# Altium footprint library connectors.PcbLib: 256 footprints (part 4 of 16)
Each footprint in its own frame and in the unit in brackets; x right, y up, seen from the top. Pads: shape width x height; smd on the part's side, far side on the other; paste and mask are expansions set on the pad; w line width, h text height; cw(c..) or ccw(c..) is an arc to the next point about the centre after c.
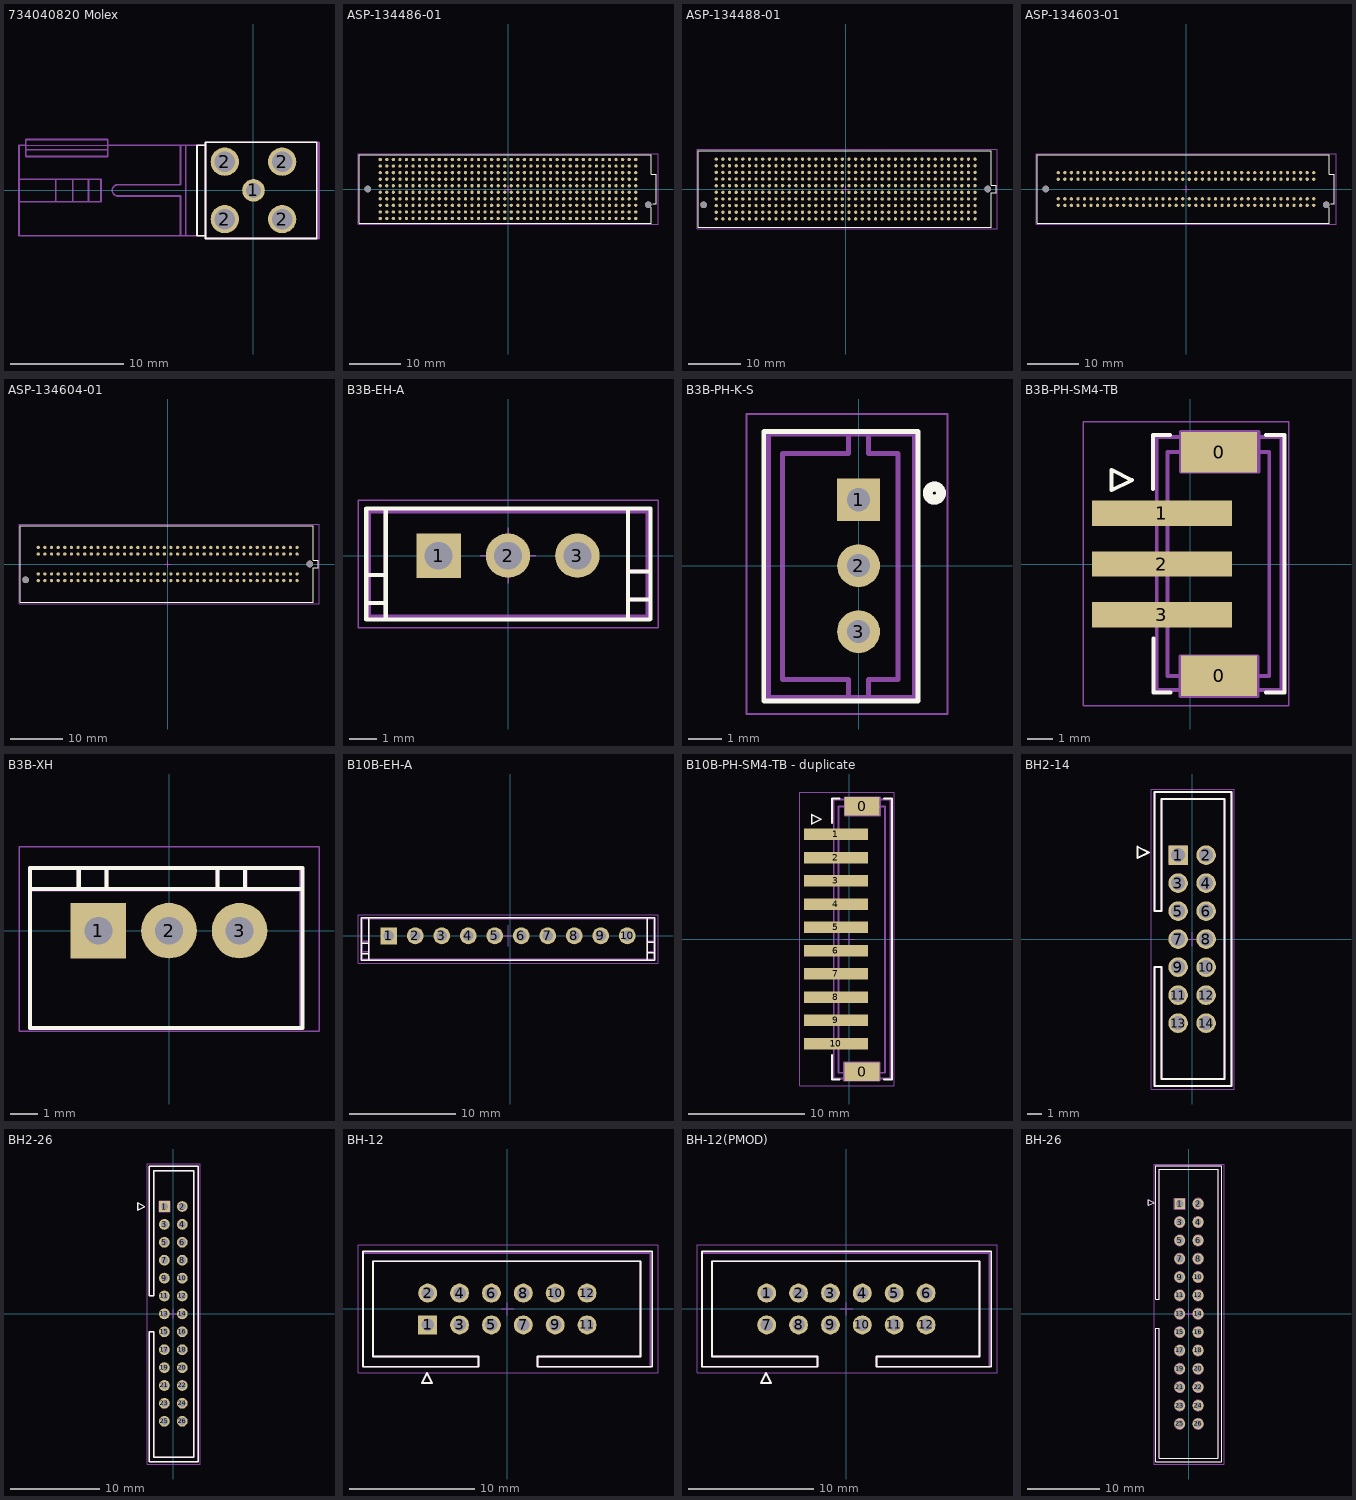
[diagram p3: the footprints below, top view; thin cyan lines are the x and y axes]

## 734040820 Molex [mm] "FAKRA Code Z/Water Blue"
height 9
pads (5):
  round 2 hole 1.3: 1(0,0)
  round 2.5 hole 1.8: 2(-2.54,-2.54) 2(-2.54,2.54) 2(2.54,-2.54) 2(2.54,2.54)
Top Overlay:
  lines w0.15: -4.25,-4 -5,-4 -5,4 -4.25,4 ; -4.25,-4.25 -4.25,4.25 5.6,4.25 5.6,-4.25 -4.25,-4.25
TopAssy 13:
  lines w0.15: -20.75,-1 -13.5,-1 -13.5,1 -20.75,1 ; -20.2,4 -20.75,4 -20.75,-4 -4.25,-4 ; -20.15,3.6 -12.9,3.6 ; -17.5,-1 -17.5,1 ; -16,-1 -16,1 ; -14.6,-1 -14.6,1 ; -12.9,4 -4.25,4 ; -6.45,-4 -6.45,-0.5 -12,-0.5 cw(c-12,0) -12,0.5 -6.45,0.5 -6.45,4 ; -6,-4 -6,3.9 ; -5,-4 -5,4 ; 5.6,-4.25 5.6,4.25 ; -20.15,3 -20.15,4.5 -12.9,4.5 -12.9,3 -20.15,3 ; -4.25,-4.25 -4.25,4.25 5.8,4.25 5.8,-4.25 -4.25,-4.25
TopCourt 15:
  lines w0.05: -4.25,-4 -20.75,-4 -20.75,4 -4.25,4 ; -4.25,-4.25 5.8,-4.25 5.8,4.25 -4.25,4.25 -4.25,-4.25
3D body "734040820.stp": height 11.27, standoff -2.78, extent -20.225,-4 5.495,4

## ASP-134486-01 [mil] "CC-HPC-10, 1.27mm PITCH SOCKET ARRAY ASSEMBLY, FEMALE, VITA 57 CONNECTOR"
height 258
pads (402):
  round 25 smd paste+5 mask+2.01: A1(975,-225) A2(925,-225) A3(875,-225) A4(825,-225) A5(775,-225) A6(725,-225) A7(675,-225) A8(625,-225) A9(575,-225) A10(525,-225) A11(475,-225) A12(425,-225) A13(375,-225) A14(325,-225) A15(275,-225) A16(225,-225) A17(175,-225) A18(125,-225) A19(75,-225) A20(25,-225) A21(-25,-225) A22(-75,-225) A23(-125,-225) A24(-175,-225) A25(-225,-225) A26(-275,-225) A27(-325,-225) A28(-375,-225) A29(-425,-225) A30(-475,-225) A31(-525,-225) A32(-575,-225) A33(-625,-225) A34(-675,-225) A35(-725,-225) A36(-775,-225) A37(-825,-225) A38(-875,-225) A39(-925,-225) A40(-975,-225) B1(975,-175) B2(925,-175) B3(875,-175) B4(825,-175) B5(775,-175) B6(725,-175) B7(675,-175) B8(625,-175) B9(575,-175) B10(525,-175) B11(475,-175) B12(425,-175) B13(375,-175) B14(325,-175) B15(275,-175) B16(225,-175) B17(175,-175) B18(125,-175) B19(75,-175) B20(25,-175) B21(-25,-175) B22(-75,-175) B23(-125,-175) B24(-175,-175) B25(-225,-175) B26(-275,-175) B27(-325,-175) B28(-375,-175) B29(-425,-175) B30(-475,-175) B31(-525,-175) B32(-575,-175) B33(-625,-175) B34(-675,-175) B35(-725,-175) B36(-775,-175) B37(-825,-175) B38(-875,-175) B39(-925,-175) B40(-975,-175) E1(975,-25) E2(925,-25) E3(875,-25) E4(825,-25) E5(775,-25) E6(725,-25) E7(675,-25) E8(625,-25) E9(575,-25) E10(525,-25) E11(475,-25) E12(425,-25) E13(375,-25) E14(325,-25) E15(275,-25) E16(225,-25) E17(175,-25) E18(125,-25) E19(75,-25) E20(25,-25) E21(-25,-25) E22(-75,-25) E23(-125,-25) E24(-175,-25) E25(-225,-25) E26(-275,-25) E27(-325,-25) E28(-375,-25) E29(-425,-25) E30(-475,-25) E31(-525,-25) E32(-575,-25) E33(-625,-25) E34(-675,-25) E35(-725,-25) E36(-775,-25) E37(-825,-25) E38(-875,-25) E39(-925,-25) E40(-975,-25) F1(975,25) F2(925,25) F3(875,25) F4(825,25) F5(775,25) F6(725,25) F7(675,25) F8(625,25) F9(575,25) F10(525,25) F11(475,25) F12(425,25) F13(375,25) F14(325,25) F15(275,25) F16(225,25) F17(175,25) F18(125,25) F19(75,25) F20(25,25) F21(-25,25) F22(-75,25) F23(-125,25) F24(-175,25) F25(-225,25) F26(-275,25) F27(-325,25) F28(-375,25) F29(-425,25) F30(-475,25) F31(-525,25) F32(-575,25) F33(-625,25) F34(-675,25) F35(-725,25) F36(-775,25) F37(-825,25) F38(-875,25) F39(-925,25) F40(-975,25) J1(975,175) J2(925,175) J3(875,175) J4(825,175) J5(775,175) J6(725,175) J7(675,175) J8(625,175) J9(575,175) J10(525,175) J11(475,175) J12(425,175) J13(375,175) J14(325,175) J15(275,175) J16(225,175) J17(175,175) J18(125,175) J19(75,175) J20(25,175) J21(-25,175) J22(-75,175) J23(-125,175) J24(-175,175) J25(-225,175) J26(-275,175) J27(-325,175) J28(-375,175) J29(-425,175) J30(-475,175) J31(-525,175) J32(-575,175) J33(-625,175) J34(-675,175) J35(-725,175) J36(-775,175) J37(-825,175) J38(-875,175) J39(-925,175) J40(-975,175) K1(975,225) K2(925,225) K3(875,225) K4(825,225) K5(775,225) K6(725,225) K7(675,225) K8(625,225) K9(575,225) K10(525,225) K11(475,225) K12(425,225) K13(375,225) K14(325,225) K15(275,225) K16(225,225) K17(175,225) K18(125,225) K19(75,225) K20(25,225) K21(-25,225) K22(-75,225) K23(-125,225) K24(-175,225) K25(-225,225) K26(-275,225) K27(-325,225) K28(-375,225) K29(-425,225) K30(-475,225) K31(-525,225) K32(-575,225) K33(-625,225) K34(-675,225) K35(-725,225) K36(-775,225) K37(-825,225) K38(-875,225) K39(-925,225) K40(-975,225)
  round 25 smd paste+5 mask+2: C1(975,-125) C2(925,-125) C3(875,-125) C4(825,-125) C5(775,-125) C6(725,-125) C7(675,-125) C8(625,-125) C9(575,-125) C10(525,-125) C11(475,-125) C12(425,-125) C13(375,-125) C14(325,-125) C15(275,-125) C16(225,-125) C17(175,-125) C18(125,-125) C19(75,-125) C20(25,-125) C21(-25,-125) C22(-75,-125) C23(-125,-125) C24(-175,-125) C25(-225,-125) C26(-275,-125) C27(-325,-125) C28(-375,-125) C29(-425,-125) C30(-475,-125) C31(-525,-125) C32(-575,-125) C33(-625,-125) C34(-675,-125) C35(-725,-125) C36(-775,-125) C37(-825,-125) C38(-875,-125) C39(-925,-125) C40(-975,-125) D1(975,-75) D2(925,-75) D3(875,-75) D4(825,-75) D5(775,-75) D6(725,-75) D7(675,-75) D8(625,-75) D9(575,-75) D10(525,-75) D11(475,-75) D12(425,-75) D13(375,-75) D14(325,-75) D15(275,-75) D16(225,-75) D17(175,-75) D18(125,-75) D19(75,-75) D20(25,-75) D21(-25,-75) D22(-75,-75) D23(-125,-75) D24(-175,-75) D25(-225,-75) D26(-275,-75) D27(-325,-75) D28(-375,-75) D29(-425,-75) D30(-475,-75) D31(-525,-75) D32(-575,-75) D33(-625,-75) D34(-675,-75) D35(-725,-75) D36(-775,-75) D37(-825,-75) D38(-875,-75) D39(-925,-75) D40(-975,-75) G1(975,75) G2(925,75) G3(875,75) G4(825,75) G5(775,75) G6(725,75) G7(675,75) G8(625,75) G9(575,75) G10(525,75) G11(475,75) G12(425,75) G13(375,75) G14(325,75) G15(275,75) G16(225,75) G17(175,75) G18(125,75) G19(75,75) G20(25,75) G21(-25,75) G22(-75,75) G23(-125,75) G24(-175,75) G25(-225,75) G26(-275,75) G27(-325,75) G28(-375,75) G29(-425,75) G30(-475,75) G31(-525,75) G32(-575,75) G33(-625,75) G34(-675,75) G35(-725,75) G36(-775,75) G37(-825,75) G38(-875,75) G39(-925,75) G40(-975,75) H1(975,125) H2(925,125) H3(875,125) H4(825,125) H5(775,125) H6(725,125) H7(675,125) H8(625,125) H9(575,125) H10(525,125) H11(475,125) H12(425,125) H13(375,125) H14(325,125) H15(275,125) H16(225,125) H17(175,125) H18(125,125) H19(75,125) H20(25,125) H21(-25,125) H22(-75,125) H23(-125,125) H24(-175,125) H25(-225,125) H26(-275,125) H27(-325,125) H28(-375,125) H29(-425,125) H30(-475,125) H31(-525,125) H32(-575,125) H33(-625,125) H34(-675,125) H35(-725,125) H36(-775,125) H37(-825,125) H38(-875,125) H39(-925,125) H40(-975,125)
  round 50 hole 50 unplated paste+0 mask+0: MH1(-1070.5,0) MH2(1070.5,-120)
Top Overlay:
  lines w7.87: 1095,-140 1095,-260 -1135,-260 -1135,260 1095,260 1095,112.2 1133,112.2 1133,-113.19 1105,-113.19
TopCourt 15:
  lines w3.94: -25,0 25,0 ; 0,-25 0,25 ; -1145,-270 -1145,270 1145,270 1145,-270 -1145,-270
3D body "SEAF-40-06.5-L-10-2-A-K-TR.stp": height 259, standoff -49, extent -1131,-262.5 1131,260.5

## ASP-134488-01 [mil] "MC-HPC-10, 1.27mm PITCH TERMINAL ARRAY ASSEMBLY, MALE, VITA 57 CONNECTOR"
height 280
pads (402):
  round 25 smd paste+5 mask+2.01: A1(975,225) A2(925,225) A3(875,225) A4(825,225) A5(775,225) A6(725,225) A7(675,225) A8(625,225) A9(575,225) A10(525,225) A11(475,225) A12(425,225) A13(375,225) A14(325,225) A15(275,225) A16(225,225) A17(175,225) A18(125,225) A19(75,225) A20(25,225) A21(-25,225) A22(-75,225) A23(-125,225) A24(-175,225) A25(-225,225) A26(-275,225) A27(-325,225) A28(-375,225) A29(-425,225) A30(-475,225) A31(-525,225) A32(-575,225) A33(-625,225) A34(-675,225) A35(-725,225) A36(-775,225) A37(-825,225) A38(-875,225) A39(-925,225) A40(-975,225) B1(975,175) B2(925,175) B3(875,175) B4(825,175) B5(775,175) B6(725,175) B7(675,175) B8(625,175) B9(575,175) B10(525,175) B11(475,175) B12(425,175) B13(375,175) B14(325,175) B15(275,175) B16(225,175) B17(175,175) B18(125,175) B19(75,175) B20(25,175) B21(-25,175) B22(-75,175) B23(-125,175) B24(-175,175) B25(-225,175) B26(-275,175) B27(-325,175) B28(-375,175) B29(-425,175) B30(-475,175) B31(-525,175) B32(-575,175) B33(-625,175) B34(-675,175) B35(-725,175) B36(-775,175) B37(-825,175) B38(-875,175) B39(-925,175) B40(-975,175) E1(975,25) E2(925,25) E3(875,25) E4(825,25) E5(775,25) E6(725,25) E7(675,25) E8(625,25) E9(575,25) E10(525,25) E11(475,25) E12(425,25) E13(375,25) E14(325,25) E15(275,25) E16(225,25) E17(175,25) E18(125,25) E19(75,25) E20(25,25) E21(-25,25) E22(-75,25) E23(-125,25) E24(-175,25) E25(-225,25) E26(-275,25) E27(-325,25) E28(-375,25) E29(-425,25) E30(-475,25) E31(-525,25) E32(-575,25) E33(-625,25) E34(-675,25) E35(-725,25) E36(-775,25) E37(-825,25) E38(-875,25) E39(-925,25) E40(-975,25) F1(975,-25) F2(925,-25) F3(875,-25) F4(825,-25) F5(775,-25) F6(725,-25) F7(675,-25) F8(625,-25) F9(575,-25) F10(525,-25) F11(475,-25) F12(425,-25) F13(375,-25) F14(325,-25) F15(275,-25) F16(225,-25) F17(175,-25) F18(125,-25) F19(75,-25) F20(25,-25) F21(-25,-25) F22(-75,-25) F23(-125,-25) F24(-175,-25) F25(-225,-25) F26(-275,-25) F27(-325,-25) F28(-375,-25) F29(-425,-25) F30(-475,-25) F31(-525,-25) F32(-575,-25) F33(-625,-25) F34(-675,-25) F35(-725,-25) F36(-775,-25) F37(-825,-25) F38(-875,-25) F39(-925,-25) F40(-975,-25) J1(975,-175) J2(925,-175) J3(875,-175) J4(825,-175) J5(775,-175) J6(725,-175) J7(675,-175) J8(625,-175) J9(575,-175) J10(525,-175) J11(475,-175) J12(425,-175) J13(375,-175) J14(325,-175) J15(275,-175) J16(225,-175) J17(175,-175) J18(125,-175) J19(75,-175) J20(25,-175) J21(-25,-175) J22(-75,-175) J23(-125,-175) J24(-175,-175) J25(-225,-175) J26(-275,-175) J27(-325,-175) J28(-375,-175) J29(-425,-175) J30(-475,-175) J31(-525,-175) J32(-575,-175) J33(-625,-175) J34(-675,-175) J35(-725,-175) J36(-775,-175) J37(-825,-175) J38(-875,-175) J39(-925,-175) J40(-975,-175) K1(975,-225) K2(925,-225) K3(875,-225) K4(825,-225) K5(775,-225) K6(725,-225) K7(675,-225) K8(625,-225) K9(575,-225) K10(525,-225) K11(475,-225) K12(425,-225) K13(375,-225) K14(325,-225) K15(275,-225) K16(225,-225) K17(175,-225) K18(125,-225) K19(75,-225) K20(25,-225) K21(-25,-225) K22(-75,-225) K23(-125,-225) K24(-175,-225) K25(-225,-225) K26(-275,-225) K27(-325,-225) K28(-375,-225) K29(-425,-225) K30(-475,-225) K31(-525,-225) K32(-575,-225) K33(-625,-225) K34(-675,-225) K35(-725,-225) K36(-775,-225) K37(-825,-225) K38(-875,-225) K39(-925,-225) K40(-975,-225)
  round 25 smd paste+5 mask+2: C1(975,125) C2(925,125) C3(875,125) C4(825,125) C5(775,125) C6(725,125) C7(675,125) C8(625,125) C9(575,125) C10(525,125) C11(475,125) C12(425,125) C13(375,125) C14(325,125) C15(275,125) C16(225,125) C17(175,125) C18(125,125) C19(75,125) C20(25,125) C21(-25,125) C22(-75,125) C23(-125,125) C24(-175,125) C25(-225,125) C26(-275,125) C27(-325,125) C28(-375,125) C29(-425,125) C30(-475,125) C31(-525,125) C32(-575,125) C33(-625,125) C34(-675,125) C35(-725,125) C36(-775,125) C37(-825,125) C38(-875,125) C39(-925,125) C40(-975,125) D1(975,75) D2(925,75) D3(875,75) D4(825,75) D5(775,75) D6(725,75) D7(675,75) D8(625,75) D9(575,75) D10(525,75) D11(475,75) D12(425,75) D13(375,75) D14(325,75) D15(275,75) D16(225,75) D17(175,75) D18(125,75) D19(75,75) D20(25,75) D21(-25,75) D22(-75,75) D23(-125,75) D24(-175,75) D25(-225,75) D26(-275,75) D27(-325,75) D28(-375,75) D29(-425,75) D30(-475,75) D31(-525,75) D32(-575,75) D33(-625,75) D34(-675,75) D35(-725,75) D36(-775,75) D37(-825,75) D38(-875,75) D39(-925,75) D40(-975,75) G1(975,-75) G2(925,-75) G3(875,-75) G4(825,-75) G5(775,-75) G6(725,-75) G7(675,-75) G8(625,-75) G9(575,-75) G10(525,-75) G11(475,-75) G12(425,-75) G13(375,-75) G14(325,-75) G15(275,-75) G16(225,-75) G17(175,-75) G18(125,-75) G19(75,-75) G20(25,-75) G21(-25,-75) G22(-75,-75) G23(-125,-75) G24(-175,-75) G25(-225,-75) G26(-275,-75) G27(-325,-75) G28(-375,-75) G29(-425,-75) G30(-475,-75) G31(-525,-75) G32(-575,-75) G33(-625,-75) G34(-675,-75) G35(-725,-75) G36(-775,-75) G37(-825,-75) G38(-875,-75) G39(-925,-75) G40(-975,-75) H1(975,-125) H2(925,-125) H3(875,-125) H4(825,-125) H5(775,-125) H6(725,-125) H7(675,-125) H8(625,-125) H9(575,-125) H10(525,-125) H11(475,-125) H12(425,-125) H13(375,-125) H14(325,-125) H15(275,-125) H16(225,-125) H17(175,-125) H18(125,-125) H19(75,-125) H20(25,-125) H21(-25,-125) H22(-75,-125) H23(-125,-125) H24(-175,-125) H25(-225,-125) H26(-275,-125) H27(-325,-125) H28(-375,-125) H29(-425,-125) H30(-475,-125) H31(-525,-125) H32(-575,-125) H33(-625,-125) H34(-675,-125) H35(-725,-125) H36(-775,-125) H37(-825,-125) H38(-875,-125) H39(-925,-125) H40(-975,-125)
  round 50 hole 50 unplated paste+0 mask+0: MH1(1070.5,0) MH2(-1070.5,-120)
Top Overlay:
  lines w7.87: -1110,-289 -1110,289 1098,289 1098,30 1133,30 1133,-30 1098,-30 1098,-289 -1110,-289
TopCourt 15:
  lines w3.94: -25,0 25,0 ; 0,-25 0,25 ; 1140,-35 1140,300 -1120,300 -1120,-300 1120,-300 1140,-300 1140,-20
3D body "SEAM-40-03.5-S-10-2-A-K-TR.stp": height 281.07, standoff -48.93, extent -1098,-289 1133,289

## ASP-134603-01 [mil] "CC-LPC-10, 1.27mm PITCH SOCKET ARRAY ASSEMBLY, FEMALE, VITA 57 CONNECTOR"
height 258
pads (162):
  round 25 smd paste+5 mask+2: C1(975,-125) C2(925,-125) C3(875,-125) C4(825,-125) C5(775,-125) C6(725,-125) C7(675,-125) C8(625,-125) C9(575,-125) C10(525,-125) C11(475,-125) C12(425,-125) C13(375,-125) C14(325,-125) C15(275,-125) C16(225,-125) C17(175,-125) C18(125,-125) C19(75,-125) C20(25,-125) C21(-25,-125) C22(-75,-125) C23(-125,-125) C24(-175,-125) C25(-225,-125) C26(-275,-125) C27(-325,-125) C28(-375,-125) C29(-425,-125) C30(-475,-125) C31(-525,-125) C32(-575,-125) C33(-625,-125) C34(-675,-125) C35(-725,-125) C36(-775,-125) C37(-825,-125) C38(-875,-125) C39(-925,-125) C40(-975,-125) D1(975,-75) D2(925,-75) D3(875,-75) D4(825,-75) D5(775,-75) D6(725,-75) D7(675,-75) D8(625,-75) D9(575,-75) D10(525,-75) D11(475,-75) D12(425,-75) D13(375,-75) D14(325,-75) D15(275,-75) D16(225,-75) D17(175,-75) D18(125,-75) D19(75,-75) D20(25,-75) D21(-25,-75) D22(-75,-75) D23(-125,-75) D24(-175,-75) D25(-225,-75) D26(-275,-75) D27(-325,-75) D28(-375,-75) D29(-425,-75) D30(-475,-75) D31(-525,-75) D32(-575,-75) D33(-625,-75) D34(-675,-75) D35(-725,-75) D36(-775,-75) D37(-825,-75) D38(-875,-75) D39(-925,-75) D40(-975,-75) G1(975,75) G2(925,75) G3(875,75) G4(825,75) G5(775,75) G6(725,75) G7(675,75) G8(625,75) G9(575,75) G10(525,75) G11(475,75) G12(425,75) G13(375,75) G14(325,75) G15(275,75) G16(225,75) G17(175,75) G18(125,75) G19(75,75) G20(25,75) G21(-25,75) G22(-75,75) G23(-125,75) G24(-175,75) G25(-225,75) G26(-275,75) G27(-325,75) G28(-375,75) G29(-425,75) G30(-475,75) G31(-525,75) G32(-575,75) G33(-625,75) G34(-675,75) G35(-725,75) G36(-775,75) G37(-825,75) G38(-875,75) G39(-925,75) G40(-975,75) H1(975,125) H2(925,125) H3(875,125) H4(825,125) H5(775,125) H6(725,125) H7(675,125) H8(625,125) H9(575,125) H10(525,125) H11(475,125) H12(425,125) H13(375,125) H14(325,125) H15(275,125) H16(225,125) H17(175,125) H18(125,125) H19(75,125) H20(25,125) H21(-25,125) H22(-75,125) H23(-125,125) H24(-175,125) H25(-225,125) H26(-275,125) H27(-325,125) H28(-375,125) H29(-425,125) H30(-475,125) H31(-525,125) H32(-575,125) H33(-625,125) H34(-675,125) H35(-725,125) H36(-775,125) H37(-825,125) H38(-875,125) H39(-925,125) H40(-975,125)
  round 50 hole 50 unplated paste+0 mask+0: MH1(-1070.5,0) MH2(1070.5,-120)
Top Overlay:
  lines w7.87: 1095,-140 1095,-260 -1135,-260 -1135,260 1095,260 1095,112.2 1133,112.2 1133,-113.19 1105,-113.19
TopCourt 15:
  lines w3.94: -25,0 25,0 ; 0,-25 0,25 ; -1145,-270 -1145,270 1145,270 1145,-270 -1145,-270
3D body "SEAF-40-06.5-L-10-2-A-K-TR.stp": height 259, standoff -49, extent -1131,-262.5 1131,260.5

## ASP-134604-01 [mil] "MC-LPC-10, 1.27mm PITCH TERMINAL ARRAY ASSEMBLY, MALE, VITA 57 CONNECTOR"
height 280
pads (162):
  round 25 smd paste+5 mask+2: C1(975,125) C2(925,125) C3(875,125) C4(825,125) C5(775,125) C6(725,125) C7(675,125) C8(625,125) C9(575,125) C10(525,125) C11(475,125) C12(425,125) C13(375,125) C14(325,125) C15(275,125) C16(225,125) C17(175,125) C18(125,125) C19(75,125) C20(25,125) C21(-25,125) C22(-75,125) C23(-125,125) C24(-175,125) C25(-225,125) C26(-275,125) C27(-325,125) C28(-375,125) C29(-425,125) C30(-475,125) C31(-525,125) C32(-575,125) C33(-625,125) C34(-675,125) C35(-725,125) C36(-775,125) C37(-825,125) C38(-875,125) C39(-925,125) C40(-975,125) D1(975,75) D2(925,75) D3(875,75) D4(825,75) D5(775,75) D6(725,75) D7(675,75) D8(625,75) D9(575,75) D10(525,75) D11(475,75) D12(425,75) D13(375,75) D14(325,75) D15(275,75) D16(225,75) D17(175,75) D18(125,75) D19(75,75) D20(25,75) D21(-25,75) D22(-75,75) D23(-125,75) D24(-175,75) D25(-225,75) D26(-275,75) D27(-325,75) D28(-375,75) D29(-425,75) D30(-475,75) D31(-525,75) D32(-575,75) D33(-625,75) D34(-675,75) D35(-725,75) D36(-775,75) D37(-825,75) D38(-875,75) D39(-925,75) D40(-975,75) G1(975,-75) G2(925,-75) G3(875,-75) G4(825,-75) G5(775,-75) G6(725,-75) G7(675,-75) G8(625,-75) G9(575,-75) G10(525,-75) G11(475,-75) G12(425,-75) G13(375,-75) G14(325,-75) G15(275,-75) G16(225,-75) G17(175,-75) G18(125,-75) G19(75,-75) G20(25,-75) G21(-25,-75) G22(-75,-75) G23(-125,-75) G24(-175,-75) G25(-225,-75) G26(-275,-75) G27(-325,-75) G28(-375,-75) G29(-425,-75) G30(-475,-75) G31(-525,-75) G32(-575,-75) G33(-625,-75) G34(-675,-75) G35(-725,-75) G36(-775,-75) G37(-825,-75) G38(-875,-75) G39(-925,-75) G40(-975,-75) H1(975,-125) H2(925,-125) H3(875,-125) H4(825,-125) H5(775,-125) H6(725,-125) H7(675,-125) H8(625,-125) H9(575,-125) H10(525,-125) H11(475,-125) H12(425,-125) H13(375,-125) H14(325,-125) H15(275,-125) H16(225,-125) H17(175,-125) H18(125,-125) H19(75,-125) H20(25,-125) H21(-25,-125) H22(-75,-125) H23(-125,-125) H24(-175,-125) H25(-225,-125) H26(-275,-125) H27(-325,-125) H28(-375,-125) H29(-425,-125) H30(-475,-125) H31(-525,-125) H32(-575,-125) H33(-625,-125) H34(-675,-125) H35(-725,-125) H36(-775,-125) H37(-825,-125) H38(-875,-125) H39(-925,-125) H40(-975,-125)
  round 50 hole 50 unplated paste+0 mask+0: MH1(1070.5,0) MH2(-1070.5,-120)
Top Overlay:
  lines w7.87: -1110,-289 -1110,289 1098,289 1098,30 1133,30 1133,-30 1098,-30 1098,-289 -1110,-289
TopCourt 15:
  lines w3.94: -25,0 25,0 ; 0,-25 0,25 ; 1140,-35 1140,300 -1120,300 -1120,-300 1120,-300 1140,-300 1140,-20
3D body "SEAM-40-03.5-S-10-2-A-K-TR.stp": height 281.07, standoff -48.93, extent -1098,-289 1133,289

## B3B-EH-A [mm] "(B3B-EH-A) шаг 2,00 mm (EН-тип) 2 мм вилка на плату прямая"
height 11.4
pads (3):
  rect 1.6x1.6 hole 1: 1(-2.5,0)
  round 1.6 hole 1: 2(0,0) 3(2.5,0)
Top Overlay:
  lines w0.15: -5,-1.7 -4.4,-1.7 ; -5,-0.7 -4.4,-0.7 ; -4.4,-2.3 -4.401,1.6 ; 4.325,-2.275 4.325,1.7 ; 4.325,-0.575 5.125,-0.575 ; 4.375,-1.575 5.125,-1.575 ; -5.1,-2.3 -5.1,1.7 5.125,1.7 5.125,-2.275 5.1,-2.3 -5.1,-2.3
  text "." at -4,2.2 h1.52
TopAssy 13:
  lines w0.15: -5,-1.7 -4.4,-1.7 ; -5,-0.7 -4.4,-0.7 ; -4.4,-2.2 -4.4,1.6 ; 4.325,-2.2 4.325,1.6 ; 4.325,-1.575 5.025,-1.575 ; 4.325,-0.575 5.025,-0.575 ; 5.025,-2.2 -5,-2.2 -5,1.6 5.025,1.6 5.025,-2.175
TopCourt 15:
  lines w0.05: -1,0 1,0 ; 0,-1 0,1 ; -5.4,-2.6 -5.4,2 5.4,2 5.4,-2.6 -5.4,-2.6
3D body "User Library-CON_B3BEHA.step": height 6, standoff -3.2, extent -5,-2.2 5,1.6

## B3B-PH-K-S [mm] "2 mm Contact Pitch, Board-to-Cable, JST"
height 6
pads (3):
  rect 1.3x1.3 hole 0.7: 1(0,2)
  round 1.3 hole 0.7: 2(0,0) 3(0,-2)
Top Overlay:
  circle w0.3: c2.3,2.2 r0.2
  lines w0.15: -2.875,-4.1 -2.875,4.075 1.8,4.075 1.8,-4.1 -2.85,-4.1
TopAssy 13:
  circle w0.3: c2.3,2.2 r0.2
  lines w0.15: -0.3,-3.95 -0.3,-3.45 -2.3,-3.45 -2.3,3.4 -0.3,3.4 -0.3,3.9 ; 0.3,-3.95 0.3,-3.45 1.2,-3.45 1.2,3.4 0.3,3.4 0.3,3.9 ; -2.725,-4 1.7,-4 1.7,4 -2.725,4 -2.725,-4
TopCourt 15:
  circle w0.05: c0,0 r0.361
  lines w0.05: -0.5,0 0.5,0 ; 0,-0.5 0,0.5 ; -3.4,-4.5 2.7,-4.5 2.7,4.6 -3.4,4.6 -3.4,-4.5
3D body "B3B-PH-K-S.STEP": height 6.05, standoff -3.35, extent -2.8,-3.95 1.7,3.95

## B3B-PH-SM4-TB [mm] "2 mm Contact Pitch, Board-to-Cable, JST"
height 6.6
pads (5):
  rect 3x1.6 smd: 0(1.125,-4.4) 0(1.125,4.4)
  rect 5.5x1 smd: 1(-1.125,2) 2(-1.125,0) 3(-1.125,-2)
Top Overlay:
  lines w0.15: -1.475,2.95 -1.475,5.075 -0.8,5.075 ; -1.45,-2.925 -1.45,-5.05 -0.775,-5.05 ; 2.975,-5.05 3.7,-5.05 3.7,5.075 2.975,5.075 ; -3.1,2.9 -3.1,3.7 -2.3,3.3 -3.1,2.9
TopAssy 13:
  lines w0.15: -1.375,-2.15 -3.325,-2.15 -3.325,-1.85 -1.375,-1.85 ; -1.375,-0.15 -3.325,-0.15 -3.325,0.15 -1.375,0.15 ; -1.375,1.85 -3.325,1.85 -3.325,2.15 -1.375,2.15 ; 0.8,-4.9 0.8,-4.4 -0.9,-4.4 -0.9,4.4 0.8,4.4 0.8,4.9 ; 1.4,-4.9 1.4,-4.4 3.1,-4.4 3.1,4.4 1.4,4.4 1.4,4.9 ; -1.325,-4.95 -1.325,5 3.575,5 3.575,-4.95 -1.325,-4.95 ; -0.5,2 0.3,2.4 0.3,1.6 -0.5,2 ; -0.4,-5.2 2.65,-5.2 2.65,-3.625 -0.4,-3.625 -0.4,-5.2 ; -0.375,3.625 2.675,3.625 2.675,5.2 -0.375,5.2 -0.375,3.625
TopCourt 15:
  lines w0.05: -4.225,-5.575 3.875,-5.575 3.875,5.6 -4.225,5.6 -4.225,-5.575
3D body "B3B-PH-SM4-TB.STEP": height 6.65, standoff 0.05, extent -3.375,-4.95 3.625,5

## B3B-XH [mm] "Разъем питания"
height 11.4
pads (3):
  rect 2x2 hole 1: 1(-2.54,0)
  round 2 hole 1: 2(0,0) 3(2.54,0)
Top Overlay:
  lines w0.15: -5,1.499 4.8,1.5 ; -3.25,1.5 -3.25,2.25 ; -2.25,1.5 -2.25,2.25 ; 1.75,1.5 1.75,2.25 ; 2.73,1.5 2.73,2.25 ; -5,-3.5 -5,2.25 4.8,2.25 4.8,-3.5 -5,-3.5
  text "." at -4.2,2.6 h1.52
TopAssy 13:
  lines w0.15: -5,1.482 4.75,1.482 ; -3.25,1.5 -3.25,2.25 ; -2.25,1.5 -2.25,2.25 ; 1.75,1.5 1.75,2.25 ; 2.75,1.5 2.75,2.25 ; -5,-3.5 -5,2.25 4.75,2.25 4.75,-3.5 -5,-3.5
TopCourt 15:
  lines w0.05: -1,0 1,0 ; 0,-1 0,1 ; -5.4,-3.625 5.4,-3.625 5.4,3.025 -5.4,3.025 -5.4,-3.625
3D body "B3B-XH-AM.STEP": height 7, standoff -3.4, extent -5.075,-3.5 4.825,2.25

## B10B-EH-A [mm] "(B10B-EH-A) шаг 2,00 mm (EН-тип) 2 мм вилка на плату прямая"
height 11.4
pads (10):
  rect 1.6x1.6 hole 1: 1(-11.45,0)
  round 1.6 hole 1: 2(-8.95,0) 3(-6.45,0) 4(-3.95,0) 5(-1.45,0) 6(1.05,0) 7(3.55,0) 8(6.05,0) 9(8.55,0) 10(11.05,0)
Top Overlay:
  lines w0.15: -13.95,-1.7 -13.35,-1.7 ; -13.95,-0.7 -13.35,-0.7 ; -13.35,-2.3 -13.351,1.6 ; 12.95,-2.3 12.95,1.7 ; 12.95,-1.6 13.65,-1.6 ; 12.95,-0.6 13.65,-0.6 ; -14.05,-2.3 13.65,-2.3 13.65,1.7 -14.05,1.7 -14.05,-2.3
  text "." at -12.95,2.2 h1.52
TopAssy 13:
  lines w0.15: -13.95,-1.5 -13.35,-1.5 ; -13.95,-0.5 -13.35,-0.5 ; -13.35,-2.2 -13.35,1.6 ; 12.95,-2.2 12.95,1.6 ; 12.95,-1.5 13.55,-1.5 ; 12.95,-0.5 13.55,-0.5 ; -13.95,-2.2 13.55,-2.2 13.55,1.6 -13.95,1.6 -13.95,-2.2
TopCourt 15:
  lines w0.05: -1.2,0 0.8,0 ; -0.2,-1 -0.2,1 ; -14.35,-2.6 13.95,-2.6 13.95,2 -14.35,2 -14.35,-2.6
3D body "User Library-CON_B10BEHA.step": height 6, standoff -3.2, extent -13.95,-2.2 13.55,1.6

## B10B-PH-SM4-TB - duplicate [mm] "2 mm Contact Pitch, Board-to-Cable, JST"
height 6.6
pads (12):
  rect 3x1.6 smd: 0(1.125,-11.4) 0(1.125,11.4)
  rect 5.5x1 smd: 1(-1.125,9) 2(-1.125,7) 3(-1.125,5) 4(-1.125,3) 5(-1.125,1) 6(-1.125,-1) 7(-1.125,-3) 8(-1.125,-5) 9(-1.125,-7) 10(-1.125,-9)
Top Overlay:
  lines w0.15: -1.475,-9.95 -1.475,-12.075 -0.8,-12.075 ; -1.475,9.95 -1.475,12.075 -0.8,12.075 ; 2.975,-12.075 3.7,-12.075 3.7,12.075 2.975,12.075 ; -3.2,9.9 -3.2,10.7 -2.4,10.3 -3.2,9.9
TopAssy 13:
  lines w0.15: -1.375,-9.15 -3.325,-9.15 -3.325,-8.85 -1.375,-8.85 ; -1.375,-7.15 -3.325,-7.15 -3.325,-6.85 -1.375,-6.85 ; -1.375,-5.15 -3.325,-5.15 -3.325,-4.85 -1.375,-4.85 ; -1.375,-3.15 -3.325,-3.15 -3.325,-2.85 -1.375,-2.85 ; -1.375,-1.15 -3.325,-1.15 -3.325,-0.85 -1.375,-0.85 ; -1.375,0.85 -3.325,0.85 -3.325,1.15 -1.375,1.15 ; -1.375,2.85 -3.325,2.85 -3.325,3.15 -1.375,3.15 ; -1.375,4.85 -3.325,4.85 -3.325,5.15 -1.375,5.15 ; -1.375,6.85 -3.325,6.85 -3.325,7.15 -1.375,7.15 ; -1.375,8.85 -3.325,8.85 -3.325,9.15 -1.375,9.15 ; 0.8,-12 0.8,-11.5 -0.9,-11.5 -0.9,11.4 0.8,11.4 0.8,11.9 ; 1.4,-12 1.4,-11.5 3.1,-11.5 3.1,11.4 1.4,11.4 1.4,11.9 ; -1.325,-12 -1.325,12 3.575,12 3.575,-12 -1.325,-12 ; -0.5,9 0.3,9.4 0.3,8.6 -0.5,9 ; -0.425,-12.2 -0.425,-10.625 2.625,-10.625 2.625,-12.2 -0.425,-12.2 ; -0.375,10.625 2.675,10.625 2.675,12.2 -0.375,12.2 -0.375,10.625
TopCourt 15:
  lines w0.05: -0.5,0 0.5,0 ; 0,-0.5 0,0.5 ; -4.225,-12.6 3.875,-12.6 3.875,12.6 -4.225,12.6 -4.225,-12.6
3D body "B10B-PH-SM4-TB.STEP": height 6.65, standoff 0.05, extent -3.375,-11.975 3.625,11.975

## BH2-14 [mm] "Вилка 14 контактов на плату, шаг 2мм"
height 5.65
pads (14):
  rect 1.4x1.4 hole 1: 1(-1,6)
  round 1.4 hole 1: 2(1,6) 3(-1,4) 4(1,4) 5(-1,2) 6(1,2) 7(-1,0) 8(1,0) 9(-1,-2) 10(1,-2) 11(-1,-4) 12(1,-4) 13(-1,-6) 14(1,-6)
Top Overlay:
  lines w0.15: -3.9,5.8 -3.1,6.2 -3.9,6.6 -3.9,5.8 ; -2.7,-10.5 -2.7,-2 -2.2,-2 -2.2,-10 2.3,-10 2.3,10 -2.2,10 -2.2,2 -2.7,2 -2.7,10.5 2.8,10.5 2.8,-10.5 -2.7,-10.5
TopAssy 13:
  lines w0.15: -1.6,5.45 -1.6,6.6 -0.4,6.6 -0.4,5.45 ; -1.575,5.425 -0.425,5.425 ; -2.7,-10.5 2.8,-10.5 2.8,10.5 -2.7,10.5 -2.7,2 -2.2,2 -2.2,10 2.3,10 2.3,-10 -2.2,-10 -2.2,-2 -2.7,-2 -2.7,-10.5
TopCourt 15:
  lines w0.05: -0.5,0 0.5,0 ; 0,-0.5 0,0.5 ; -2.925,-10.7 -2.925,10.725 3.025,10.725 3.025,-10.7 -2.925,-10.7
3D body "BH2-14.STEP": height 5.7, standoff -2.6, extent -2.8,-10.6 2.8,10.6

## BH2-26 [mm] "Вилка 26 контактов на плату, шаг 2мм"
height 5.65
pads (26):
  rect 1.2x1.2 hole 0.8: 1(-1,12)
  round 1.2 hole 0.8: 2(1,12) 3(-1,10) 4(1,10) 5(-1,8) 6(1,8) 7(-1,6) 8(1,6) 9(-1,4) 10(1,4) 11(-1,2) 12(1,2) 13(-1,0) 14(1,0) 15(-1,-2) 16(1,-2) 17(-1,-4) 18(1,-4) 19(-1,-6) 20(1,-6) 21(-1,-8) 22(1,-8) 23(-1,-10) 24(1,-10) 25(-1,-12) 26(1,-12)
Top Overlay:
  lines w0.15: -4,11.6 -4,12.4 -3.2,12 -4,11.6 ; -2.7,-16.5 -2.7,-2 -2.2,-2 -2.2,-16 2.3,-16 2.3,16 -2.2,16 -2.2,2 -2.7,2 -2.7,16.5 2.8,16.5 2.8,-16.5 -2.7,-16.5
TopAssy 13:
  lines w0.15: -2.7,-16.5 2.8,-16.5 2.8,16.5 -2.7,16.5 -2.7,2 -2.2,2 -2.2,16 2.3,16 2.3,-16 -2.2,-16 -2.2,-2 -2.7,-2 -2.7,-16.5 ; -1.6,11.425 -1.6,12.575 -0.4,12.575 -0.4,11.425 -0.425,11.4 -1.575,11.4 -1.6,11.425
TopCourt 15:
  lines w0.05: -0.5,0 0.5,0 ; 0,-0.5 0,0.5 ; -2.925,-16.775 3.025,-16.775 3.025,16.75 -2.925,16.75 -2.925,-16.775
3D body "User Library-BH2-xx.step": height 5.65, standoff -3.6, extent -2.75,-16.5 2.7,16.5

## BH-12 [mm] "Разъем"
height 5
pads (12):
  rect 1.51x1.51 hole 1: 1(-6.35,-1.27)
  round 1.51 hole 1: 2(-6.35,1.27) 3(-3.81,-1.27) 4(-3.81,1.27) 5(-1.27,-1.27) 6(-1.27,1.27) 7(1.27,-1.27) 8(1.27,1.27) 9(3.81,-1.27) 10(3.81,1.27) 11(6.35,-1.27) 12(6.35,1.27)
Top Overlay:
  lines w0.15: -11.5,-4.6 -2.3,-4.6 -2.3,-3.8 -10.7,-3.8 -10.7,3.8 10.6,3.8 10.6,-3.8 2.4,-3.8 2.4,-4.6 11.544,-4.6 11.544,4.6 -11.5,4.6 -11.5,-4.6 ; -6.8,-5.9 -6,-5.9 -6.4,-5.1 -6.8,-5.9
TopAssy 13:
  lines w0.15: -11.5,-4.6 -11.5,4.45 ; -11.5,-4.6 -2.3,-4.6 -2.3,-3.8 -10.7,-3.8 -10.7,3.8 10.6,3.8 10.6,-3.8 2.4,-3.8 2.4,-4.6 11.4,-4.6 11.4,4.45 -11.5,4.45 ; -11.5,-4.6 -11.5,4.45 ; -6.8,-5.9 -6,-5.9 -6.4,-5.1 -6.8,-5.9 ; -6.755,-1.675 -6.755,-0.875 -5.98,-0.875 -5.98,-1.675 -6.755,-1.675
TopCourt 15:
  lines w0.05: -0.5,0 0.5,0 ; 0,-0.5 0,0.5 ; -11.9,-5.1 -11.9,5.1 12,5.1 12,-5.1 -11.9,-5.1
3D body "User Library-BH-12.STEP": height 9.1, standoff -3.1, extent -11.5,-4.6 11.36,4.45

## BH-12(PMOD) [mm] "Разъем"
height 5
pads (12):
  round 1.51 hole 1: 1(-6.35,1.27) 2(-3.81,1.27) 3(-1.27,1.27) 4(1.27,1.27) 5(3.81,1.27) 6(6.35,1.27) 7(-6.35,-1.27) 8(-3.81,-1.27) 9(-1.27,-1.27) 10(1.27,-1.27) 11(3.81,-1.27) 12(6.35,-1.27)
Top Overlay:
  lines w0.15: -11.5,-4.6 -2.3,-4.6 -2.3,-3.8 -10.7,-3.8 -10.7,3.8 10.6,3.8 10.6,-3.8 2.4,-3.8 2.4,-4.6 11.544,-4.6 11.544,4.6 -11.5,4.6 -11.5,-4.6 ; -6.8,-5.9 -6,-5.9 -6.4,-5.1 -6.8,-5.9
TopAssy 13:
  lines w0.15: -11.5,-4.6 -11.5,4.45 ; -11.5,-4.6 -2.3,-4.6 -2.3,-3.8 -10.7,-3.8 -10.7,3.8 10.6,3.8 10.6,-3.8 2.4,-3.8 2.4,-4.6 11.4,-4.6 11.4,4.45 -11.5,4.45 ; -11.5,-4.6 -11.5,4.45 ; -6.8,-5.9 -6,-5.9 -6.4,-5.1 -6.8,-5.9 ; -6.755,-1.675 -6.755,-0.875 -5.98,-0.875 -5.98,-1.675 -6.755,-1.675
TopCourt 15:
  lines w0.05: -0.5,0 0.5,0 ; 0,-0.5 0,0.5 ; -11.9,-5.1 -11.9,5.1 12,5.1 12,-5.1 -11.9,-5.1
3D body "User Library-BH-12.STEP": height 9.1, standoff -3.1, extent -11.5,-4.6 11.36,4.45

## BH-26 [mm] "Вилка 26 контактов на плату вертикальная, шаг 2,54мм"
height 5.65
pads (26):
  rect 1.5x1.5 hole 1: 1(-1.27,15.24)
  round 1.5 hole 1: 2(1.27,15.24) 3(-1.27,12.7) 4(1.27,12.7) 5(-1.27,10.16) 6(1.27,10.16) 7(-1.27,7.62) 8(1.27,7.62) 9(-1.27,5.08) 10(1.27,5.08) 11(-1.27,2.54) 12(1.27,2.54) 13(-1.27,0) 14(1.27,0) 15(-1.27,-2.54) 16(1.27,-2.54) 17(-1.27,-5.08) 18(1.27,-5.08) 19(-1.27,-7.62) 20(1.27,-7.62) 21(-1.27,-10.16) 22(1.27,-10.16) 23(-1.27,-12.7) 24(1.27,-12.7) 25(-1.27,-15.24) 26(1.27,-15.24)
Top Overlay:
  lines w0.15: -5.6,15 -5.6,15.8 -4.8,15.4 -5.6,15 ; -4.6,-20.5 -4.6,-2 -4.1,-2 -4.1,-20 4,-20 4,20 -4.1,20 -4.1,2 -4.6,2 -4.6,20.5 4.5,20.5 4.5,-20.5 -4.6,-20.5
TopAssy 13:
  circle w0.15: c-1.27,12.7 r0.74
  circle w0.15: c1.27,12.7 r0.74
  circle w0.15: c1.27,10.16 r0.74
  circle w0.15: c1.27,7.62 r0.74
  circle w0.15: c1.27,5.08 r0.74
  circle w0.15: c1.27,2.54 r0.74
  circle w0.15: c1.27,0 r0.74
  circle w0.15: c1.27,-2.54 r0.74
  circle w0.15: c-1.27,10.16 r0.74
  circle w0.15: c-1.27,7.62 r0.74
  circle w0.15: c-1.27,5.08 r0.74
  circle w0.15: c-1.27,2.54 r0.74
  circle w0.15: c-1.27,0 r0.74
  circle w0.15: c-1.27,-2.54 r0.74
  circle w0.15: c-1.27,-5.08 r0.74
  circle w0.15: c-1.27,-7.62 r0.74
  circle w0.15: c-1.27,-10.16 r0.74
  circle w0.15: c-1.27,-12.7 r0.74
  circle w0.15: c1.27,-5.08 r0.74
  circle w0.15: c1.27,-7.62 r0.74
  circle w0.15: c1.27,-10.16 r0.74
  circle w0.15: c1.27,-12.7 r0.74
  circle w0.15: c1.27,-15.24 r0.74
  circle w0.15: c-1.27,-15.24 r0.74
  circle w0.15: c1.27,15.24 r0.74
  lines w0.15: -5.57,15.04 -4.77,15.44 -5.57,15.84 -5.57,15.04 ; -4.6,-20.5 -4.6,-2 -4.1,-2 -4.1,-20 4,-20 4,20 -4.1,20 -4.1,2 -4.6,2 -4.6,20.5 4.5,20.5 4.5,-20.5 -4.6,-20.5 ; -2,14.5 -2,16 -0.5,16 -0.5,14.5 -2,14.5
TopCourt 15:
  lines w0.05: -0.5,0 0.5,0 ; 0,-0.5 0,0.5 ; -4.9,-20.8 4.8,-20.8 4.8,20.74 -4.9,20.74 -4.9,-20.8
3D body "User Library-DS1013-26S (IDC-26MS CONNFLY).step": height 9, standoff -3.6, extent -4.5,-20.41 4.4,20.41